# Altium footprint library 13-Pcblib_MCU.PcbLib: 48 footprints (part 1 of 3)
Each footprint in its own frame and in the unit in brackets; x right, y up, seen from the top. Pads: shape width x height; smd on the part's side, far side on the other; paste and mask are expansions set on the pad; w line width, h text height; cw(c..) or ccw(c..) is an arc to the next point about the centre after c.
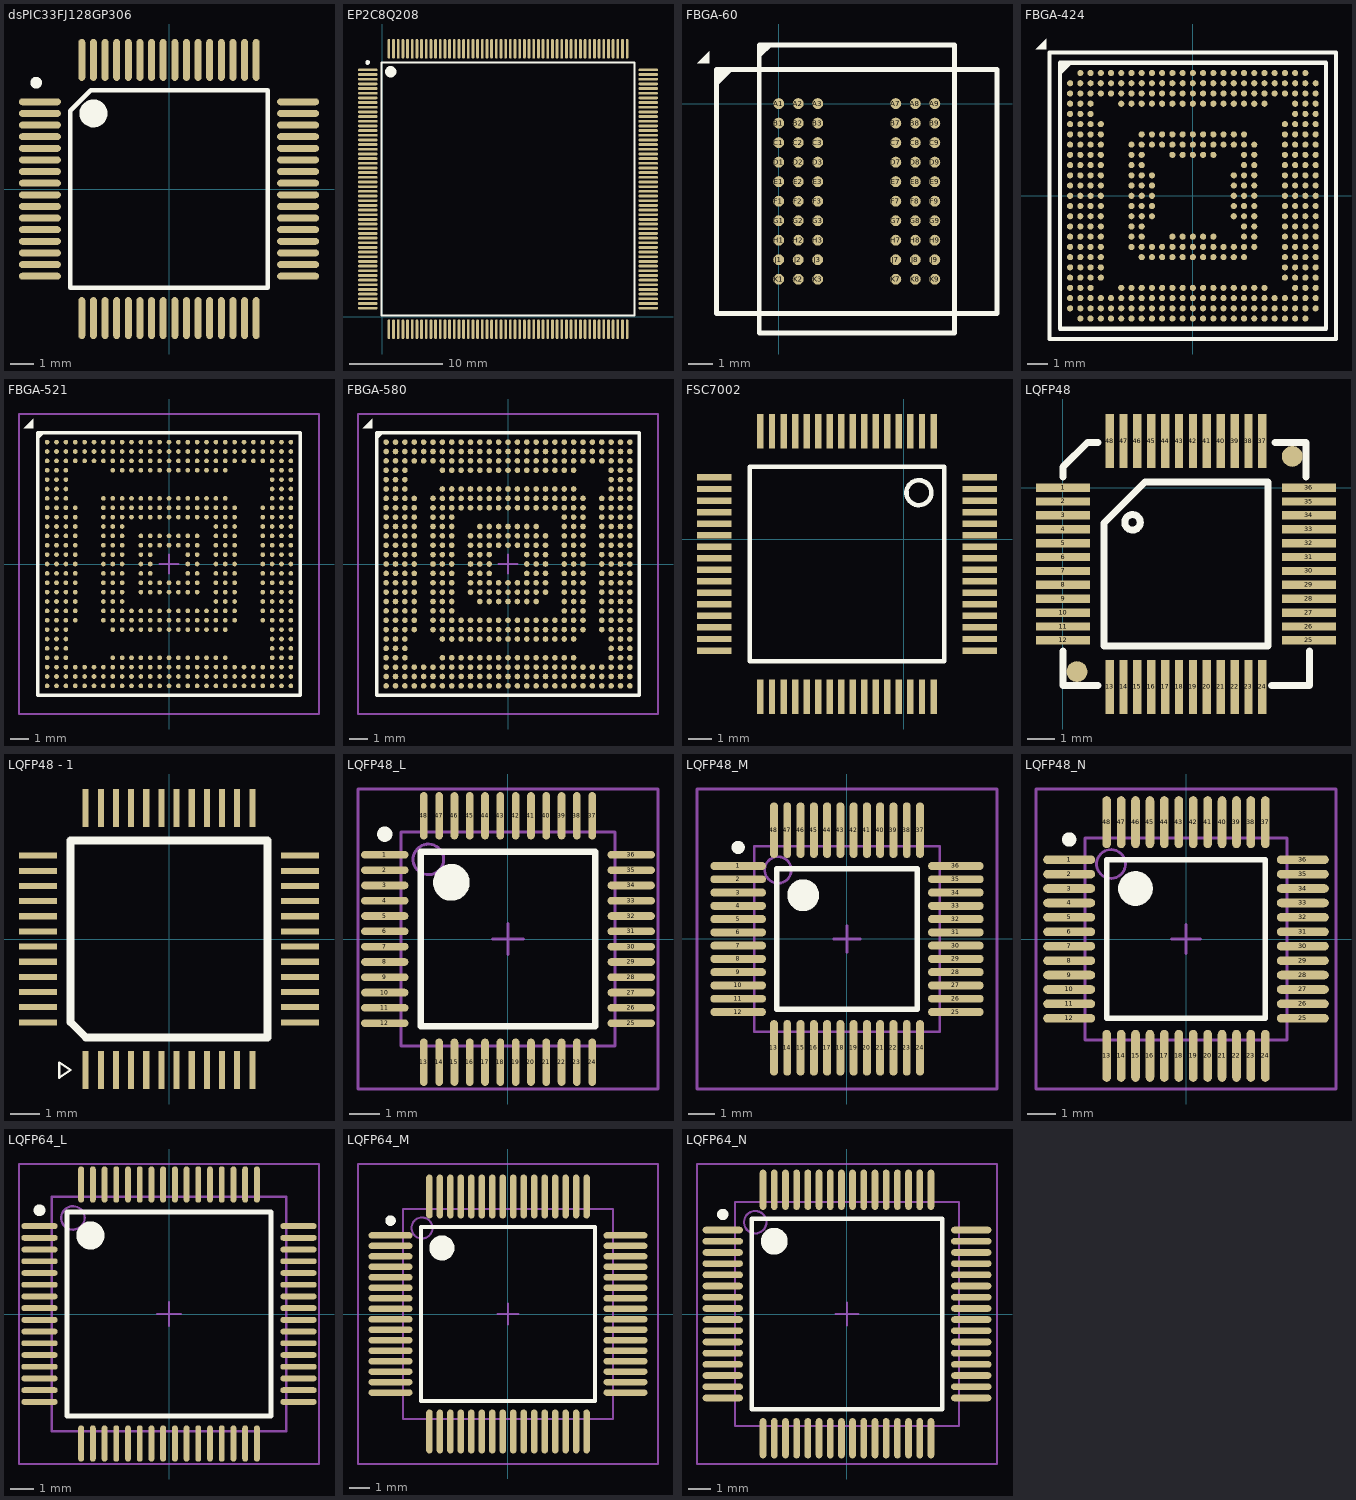
[diagram p0: the footprints below, top view; thin cyan lines are the x and y axes]

## AM335X033_W [mm]
3D body: height 3.3, standoff -6.36, extent -36.168,-23.089 33.832,22.911

## dsPIC33FJ128GP306 [mm]
height 0.9
pads (64):
  oval 1.8x0.3 smd: 1(-5.55,3.75) 2(-5.55,3.25) 3(-5.55,2.75) 4(-5.55,2.25) 5(-5.55,1.75) 6(-5.55,1.25) 7(-5.55,0.75) 8(-5.55,0.25) 9(-5.55,-0.25) 10(-5.55,-0.75) 11(-5.55,-1.25) 12(-5.55,-1.75) 13(-5.55,-2.25) 14(-5.55,-2.75) 15(-5.55,-3.25) 16(-5.55,-3.75) 33(5.55,-3.75) 34(5.55,-3.25) 35(5.55,-2.75) 36(5.55,-2.25) 37(5.55,-1.75) 38(5.55,-1.25) 39(5.55,-0.75) 40(5.55,-0.25) 41(5.55,0.25) 42(5.55,0.75) 43(5.55,1.25) 44(5.55,1.75) 45(5.55,2.25) 46(5.55,2.75) 47(5.55,3.25) 48(5.55,3.75)
  oval 0.3x1.8 smd: 17(-3.75,-5.55) 18(-3.25,-5.55) 19(-2.75,-5.55) 20(-2.25,-5.55) 21(-1.75,-5.55) 22(-1.25,-5.55) 23(-0.75,-5.55) 24(-0.25,-5.55) 25(0.25,-5.55) 26(0.75,-5.55) 27(1.25,-5.55) 28(1.75,-5.55) 29(2.25,-5.55) 30(2.75,-5.55) 31(3.25,-5.55) 32(3.75,-5.55) 49(3.75,5.55) 50(3.25,5.55) 51(2.75,5.55) 52(2.25,5.55) 53(1.75,5.55) 54(1.25,5.55) 55(0.75,5.55) 56(0.25,5.55) 57(-0.25,5.55) 58(-0.75,5.55) 59(-1.25,5.55) 60(-1.75,5.55) 61(-2.25,5.55) 62(-2.75,5.55) 63(-3.25,5.55) 64(-3.75,5.55)
Top Overlay:
  circle w0.25: c-5.713,4.572 r0.125
  circle w0.6: c-3.25,3.25 r0.3
  lines w0.2: -4.25,-4.25 -4.25,3.37 -3.37,4.25 4.25,4.25 4.25,-4.25 -4.25,-4.25
3D body: height 1.63, standoff 0, extent -6.072,-6.096 6.072,6.048

## EP2C8Q208 [mm]
pads (208):
  oval 2.1x0.3 smd: 1(-1.524,26.416) 2(-1.524,25.916) 3(-1.524,25.416) 4(-1.524,24.916) 5(-1.524,24.416) 6(-1.524,23.916) 7(-1.524,23.416) 8(-1.524,22.916) 9(-1.524,22.416) 10(-1.524,21.916) 11(-1.524,21.416) 12(-1.524,20.916) 13(-1.524,20.416) 14(-1.524,19.916) 15(-1.524,19.416) 16(-1.524,18.916) 17(-1.524,18.416) 18(-1.524,17.916) 19(-1.524,17.416) 20(-1.524,16.916) 21(-1.524,16.416) 22(-1.524,15.916) 23(-1.524,15.416) 24(-1.524,14.916) 25(-1.524,14.416) 26(-1.524,13.916) 27(-1.524,13.416) 28(-1.524,12.916) 29(-1.524,12.416) 30(-1.524,11.916) 31(-1.524,11.416) 32(-1.524,10.916) 33(-1.524,10.416) 34(-1.524,9.916) 35(-1.524,9.416) 36(-1.524,8.916) 37(-1.524,8.416) 38(-1.524,7.916) 39(-1.524,7.416) 40(-1.524,6.916) 41(-1.524,6.416) 42(-1.524,5.916) 43(-1.524,5.416) 44(-1.524,4.916) 45(-1.524,4.416) 46(-1.524,3.916) 47(-1.524,3.416) 48(-1.524,2.916) 49(-1.524,2.416) 50(-1.524,1.916) 51(-1.524,1.416) 52(-1.524,0.916) 105(28.476,0.916) 106(28.476,1.416) 107(28.476,1.916) 108(28.476,2.416) 109(28.476,2.916) 110(28.476,3.416) 111(28.476,3.916) 112(28.476,4.416) 113(28.476,4.916) 114(28.476,5.416) 115(28.476,5.916) 116(28.476,6.416) 117(28.476,6.916) 118(28.476,7.416) 119(28.476,7.916) 120(28.476,8.416) 121(28.476,8.916) 122(28.476,9.416) 123(28.476,9.916) 124(28.476,10.416) 125(28.476,10.916) 126(28.476,11.416) 127(28.476,11.916) 128(28.476,12.416) 129(28.476,12.916) 130(28.476,13.416) 131(28.476,13.916) 132(28.476,14.416) 133(28.476,14.916) 134(28.476,15.416) 135(28.476,15.916) 136(28.476,16.416) 137(28.476,16.916) 138(28.476,17.416) 139(28.476,17.916) 140(28.476,18.416) 141(28.476,18.916) 142(28.476,19.416) 143(28.476,19.916) 144(28.476,20.416) 145(28.476,20.916) 146(28.476,21.416) 147(28.476,21.916) 148(28.476,22.416) 149(28.476,22.916) 150(28.476,23.416) 151(28.476,23.916) 152(28.476,24.416) 153(28.476,24.916) 154(28.476,25.416) 155(28.476,25.916) 156(28.476,26.416)
  oval 0.3x2.1 smd: 53(0.726,-1.334) 54(1.226,-1.334) 55(1.726,-1.334) 56(2.226,-1.334) 57(2.726,-1.334) 58(3.226,-1.334) 59(3.726,-1.334) 60(4.226,-1.334) 61(4.726,-1.334) 62(5.226,-1.334) 63(5.726,-1.334) 64(6.226,-1.334) 65(6.726,-1.334) 66(7.226,-1.334) 67(7.726,-1.334) 68(8.226,-1.334) 69(8.726,-1.334) 70(9.226,-1.334) 71(9.726,-1.334) 72(10.226,-1.334) 73(10.726,-1.334) 74(11.226,-1.334) 75(11.726,-1.334) 76(12.226,-1.334) 77(12.726,-1.334) 78(13.226,-1.334) 79(13.726,-1.334) 80(14.226,-1.334) 81(14.726,-1.334) 82(15.226,-1.334) 83(15.726,-1.334) 84(16.226,-1.334) 85(16.726,-1.334) 86(17.226,-1.334) 87(17.726,-1.334) 88(18.226,-1.334) 89(18.726,-1.334) 90(19.226,-1.334) 91(19.726,-1.334) 92(20.226,-1.334) 93(20.726,-1.334) 94(21.226,-1.334) 95(21.726,-1.334) 96(22.226,-1.334) 97(22.726,-1.334) 98(23.226,-1.334) 99(23.726,-1.334) 100(24.226,-1.334) 101(24.726,-1.334) 102(25.226,-1.334) 103(25.726,-1.334) 104(26.226,-1.334) 157(26.226,28.666) 158(25.726,28.666) 159(25.226,28.666) 160(24.726,28.666) 161(24.226,28.666) 162(23.726,28.666) 163(23.226,28.666) 164(22.726,28.666) 165(22.226,28.666) 166(21.726,28.666) 167(21.226,28.666) 168(20.726,28.666) 169(20.226,28.666) 170(19.726,28.666) 171(19.226,28.666) 172(18.726,28.666) 173(18.226,28.666) 174(17.726,28.666) 175(17.226,28.666) 176(16.726,28.666) 177(16.226,28.666) 178(15.726,28.666) 179(15.226,28.666) 180(14.726,28.666) 181(14.226,28.666) 182(13.726,28.666) 183(13.226,28.666) 184(12.726,28.666) 185(12.226,28.666) 186(11.726,28.666) 187(11.226,28.666) 188(10.726,28.666) 189(10.226,28.666) 190(9.726,28.666) 191(9.226,28.666) 192(8.726,28.666) 193(8.226,28.666) 194(7.726,28.666) 195(7.226,28.666) 196(6.726,28.666) 197(6.226,28.666) 198(5.726,28.666) 199(5.226,28.666) 200(4.726,28.666) 201(4.226,28.666) 202(3.726,28.666) 203(3.226,28.666) 204(2.726,28.666) 205(2.226,28.666) 206(1.726,28.666) 207(1.226,28.666) 208(0.726,28.666)
Top Overlay:
  circle w0.6: c0.926,26.216 r0.3
  circle w0.25: c-1.547,27.203 r0.125
  lines w0.2: -0.074,0.116 27.026,0.116 27.026,27.216 -0.074,27.216 -0.074,0.116
3D body: height 3.5, standoff 0, extent -1.831,-1.579 28.755,29.007

## FBGA-60 [mm]
pads (60):
  round 0.45 smd: A1(0,0) A2(0.8,0) A3(1.6,0) A7(4.8,0) A8(5.6,0) A9(6.4,0) B1(0,-0.8) B2(0.8,-0.8) B3(1.6,-0.8) B7(4.8,-0.8) B8(5.6,-0.8) B9(6.4,-0.8) C1(0,-1.6) C2(0.8,-1.6) C3(1.6,-1.6) C7(4.8,-1.6) C8(5.6,-1.6) C9(6.4,-1.6) D1(0,-2.4) D2(0.8,-2.4) D3(1.6,-2.4) D7(4.8,-2.4) D8(5.6,-2.4) D9(6.4,-2.4) E1(0,-3.2) E2(0.8,-3.2) E3(1.6,-3.2) E7(4.8,-3.2) E8(5.6,-3.2) E9(6.4,-3.2) F1(0,-4) F2(0.8,-4) F3(1.6,-4) F7(4.8,-4) F8(5.6,-4) F9(6.4,-4) G1(0,-4.8) G2(0.8,-4.8) G3(1.6,-4.8) G7(4.8,-4.8) G8(5.6,-4.8) G9(6.4,-4.8) H1(0,-5.6) H2(0.8,-5.6) H3(1.6,-5.6) H7(4.8,-5.6) H8(5.6,-5.6) H9(6.4,-5.6) J1(0,-6.4) J2(0.8,-6.4) J3(1.6,-6.4) J7(4.8,-6.4) J8(5.6,-6.4) J9(6.4,-6.4) K1(0,-7.2) K2(0.8,-7.2) K3(1.6,-7.2) K7(4.8,-7.2) K8(5.6,-7.2) K9(6.4,-7.2)
Top Overlay:
  region: -2.85,1.65 -2.85,2.15 -3.35,1.65
  region: -2.45,1.3 -1.95,1.3 -2.45,0.8
  region: -0.75,2.4 -0.25,2.4 -0.75,1.9
  lines w0.2: -2.55,-8.6 8.95,-8.6 8.95,1.4 -2.55,1.4 -2.55,-8.6 ; -0.8,-9.4 -0.8,2.4 7.2,2.4 7.2,-9.4 -0.8,-9.4

## FBGA-424 [mm]
pads (426):
  round 0.3 smd: A2(-5.496,6) A3(-4.996,6) A4(-4.496,6) A5(-3.996,6) A6(-3.496,6) A7(-2.996,6) A8(-2.496,6) A9(-1.996,6) A10(-1.496,6) A11(-0.996,6) A12(-0.496,6) A13(0.004,6) A14(0.504,6) A15(1.004,6) A16(1.504,6) A17(2.004,6) A18(2.504,6) A19(3.004,6) A20(3.504,6) A21(4.004,6) A22(4.504,6) A23(5.004,6) A24(5.504,6) AA1(-5.996,-4) AA2(-5.496,-4) AA3(-4.996,-4) AA4(-4.496,-4) AA22(4.504,-4) AA23(5.004,-4) AA24(5.504,-4) AA25(6.004,-4) AB1(-5.996,-4.5) AB2(-5.496,-4.5) AB3(-4.996,-4.5) AB6(-3.496,-4.5) AB7(-2.996,-4.5) AB8(-2.496,-4.5) AB9(-1.996,-4.5) AB10(-1.496,-4.5) AB11(-0.996,-4.5) AB12(-0.496,-4.5) AB13(0.004,-4.5) AB14(0.504,-4.5) AB15(1.004,-4.5) AB16(1.504,-4.5) AB17(2.004,-4.5) AB18(2.504,-4.5) AB19(3.004,-4.5) AB20(3.504,-4.5) AB23(5.004,-4.5) AB24(5.504,-4.5) AB25(6.004,-4.5) AC1(-5.996,-5) AC2(-5.496,-5) AC3(-4.996,-5) AC4(-4.496,-5) AC5(-3.996,-5) AC6(-3.496,-5) AC7(-2.996,-5) AC8(-2.496,-5) AC9(-1.996,-5) AC10(-1.496,-5) AC11(-0.996,-5) AC12(-0.496,-5) AC13(0.004,-5) AC14(0.504,-5) AC15(1.004,-5) AC16(1.504,-5) AC17(2.004,-5) AC18(2.504,-5) AC19(3.004,-5) AC20(3.504,-5) AC21(4.004,-5) AC22(4.504,-5) AC23(5.004,-5) AC24(5.504,-5) AC25(6.004,-5) AD1(-5.996,-5.5) AD2(-5.496,-5.5) AD3(-4.996,-5.5) AD4(-4.496,-5.5) AD5(-3.996,-5.5) AD6(-3.496,-5.5) AD7(-2.996,-5.5) AD8(-2.496,-5.5) AD9(-1.996,-5.5) AD10(-1.496,-5.5) AD11(-0.996,-5.5) AD12(-0.496,-5.5) AD13(0.004,-5.5) AD14(0.504,-5.5) AD15(1.004,-5.5) AD16(1.504,-5.5) AD17(2.004,-5.5) AD18(2.504,-5.5) AD19(3.004,-5.5) AD20(3.504,-5.5) AD21(4.004,-5.5) AD22(4.504,-5.5) AD23(5.004,-5.5) AD24(5.504,-5.5) AD25(6.004,-5.5) AE2(-5.496,-6) AE3(-4.996,-6) AE4(-4.496,-6) AE5(-3.996,-6) AE6(-3.496,-6) AE7(-2.996,-6) AE8(-2.496,-6) AE9(-1.996,-6) AE10(-1.496,-6) AE11(-0.996,-6) AE12(-0.496,-6) AE13(0.004,-6) AE14(0.504,-6) AE15(1.004,-6) AE16(1.504,-6) AE17(2.004,-6) AE18(2.504,-6) AE19(3.004,-6) AE20(3.504,-6) AE21(4.004,-6) AE22(4.504,-6) AE23(5.004,-6) AE24(5.504,-6) B1(-5.996,5.5) B2(-5.496,5.5) B3(-4.996,5.5) B4(-4.496,5.5) B5(-3.996,5.5) B6(-3.496,5.5) B7(-2.996,5.5) B8(-2.496,5.5) B9(-1.996,5.5) B10(-1.496,5.5) B11(-0.996,5.5) B12(-0.496,5.5) B13(0.004,5.5) B14(0.504,5.5) B15(1.004,5.5) B16(1.504,5.5) B17(2.004,5.5) B18(2.504,5.5) B19(3.004,5.5) B20(3.504,5.5) B21(4.004,5.5) B22(4.504,5.5) B23(5.004,5.5) B24(5.504,5.5) B25(6.004,5.5) C1(-5.996,5) C2(-5.496,5) C3(-4.996,5) C4(-4.496,5) C5(-3.996,5) C6(-3.496,5) C7(-2.996,5) C8(-2.496,5) C9(-1.996,5) C10(-1.496,5) C11(-0.996,5) C12(-0.496,5) C13(0.004,5) C14(0.504,5) C15(1.004,5) C16(1.504,5) C17(2.004,5) C18(2.504,5) C19(3.004,5) C20(3.504,5) C21(4.004,5) C22(4.504,5) C23(5.004,5) C24(5.504,5) C25(6.004,5) D1(-5.996,4.5) D2(-5.496,4.5) D3(-4.996,4.5) D6(-3.496,4.5) D7(-2.996,4.5) D8(-2.496,4.5) D9(-1.996,4.5) D10(-1.496,4.5) D11(-0.996,4.5) D12(-0.496,4.5) D13(0.004,4.5) D14(0.504,4.5) D15(1.004,4.5) D16(1.504,4.5) D17(2.004,4.5) D18(2.504,4.5) D19(3.004,4.5) D20(3.504,4.5) D23(5.004,4.5) D24(5.504,4.5) D25(6.004,4.5) E1(-5.996,4) E2(-5.496,4) E3(-4.996,4) E23(5.004,4) E24(5.504,4) E25(6.004,4) F1(-5.996,3.5) F2(-5.496,3.5) F3(-4.996,3.5) F4(-4.496,3.5) F22(4.504,3.5) F23(5.004,3.5) F24(5.504,3.5) F25(6.004,3.5) G1(-5.996,3) G2(-5.496,3) G3(-4.996,3) G4(-4.496,3) G8(-2.496,3) G9(-1.996,3) G10(-1.496,3) G11(-0.996,3) G12(-0.496,3) G13(0.004,3) G14(0.504,3) G15(1.004,3) G16(1.504,3) G17(2.004,3) G18(2.504,3) G22(4.504,3) G23(5.004,3) G24(5.504,3) G25(6.004,3) H1(-5.996,2.5) H2(-5.496,2.5) H3(-4.996,2.5) H4(-4.496,2.5) H7(-2.996,2.5) H8(-2.496,2.5) H9(-1.996,2.5) H10(-1.496,2.5) H11(-0.996,2.5) H12(-0.496,2.5) H13(0.004,2.5) H14(0.504,2.5) H15(1.004,2.5) H16(1.504,2.5) H17(2.004,2.5) H18(2.504,2.5) H19(3.004,2.5) H22(4.504,2.5) H23(5.004,2.5) H24(5.504,2.5) H25(6.004,2.5) J1(-5.996,2) J2(-5.496,2) J3(-4.996,2) J4(-4.496,2) J7(-2.996,2) J8(-2.496,2) J11(-0.996,2) J12(-0.496,2) J13(0.004,2) J14(0.504,2) J15(1.004,2) J18(2.504,2) J19(3.004,2) J22(4.504,2) J23(5.004,2) J24(5.504,2) J25(6.004,2) K1(-5.996,1.5) K2(-5.496,1.5) K3(-4.996,1.5) K4(-4.496,1.5) K7(-2.996,1.5) K8(-2.496,1.5) K18(2.504,1.5) K19(3.004,1.5) K22(4.504,1.5) K23(5.004,1.5) K24(5.504,1.5) K25(6.004,1.5) L1(-5.996,1) L2(-5.496,1) L3(-4.996,1) L4(-4.496,1) L7(-2.996,1) L8(-2.496,1) L9(-1.996,1) L17(2.004,1) L18(2.504,1) L19(3.004,1) L22(4.504,1) L23(5.004,1) L24(5.504,1) L25(6.004,1) M1(-5.996,0.5) M2(-5.496,0.5) M3(-4.996,0.5) M4(-4.496,0.5) M7(-2.996,0.5) M8(-2.496,0.5) M9(-1.996,0.5) M17(2.004,0.5) M18(2.504,0.5) M19(3.004,0.5) M22(4.504,0.5) M23(5.004,0.5) M24(5.504,0.5) M25(6.004,0.5) N1(-5.996,0) N2(-5.496,0) N3(-4.996,0) N4(-4.496,0) N7(-2.996,0) N8(-2.496,0) N9(-1.996,0) N17(2.004,0) N18(2.504,0) N19(3.004,0) N22(4.504,0) N23(5.004,0) N24(5.504,0) N25(6.004,0) P1(-5.996,-0.5) P2(-5.496,-0.5) P3(-4.996,-0.5) P4(-4.496,-0.5) P7(-2.996,-0.5) P8(-2.496,-0.5) P9(-1.996,-0.5) P17(2.004,-0.5) P18(2.504,-0.5) P19(3.004,-0.5) P22(4.504,-0.5) P23(5.004,-0.5) P24(5.504,-0.5) P25(6.004,-0.5) R1(-5.996,-1) R2(-5.496,-1) R3(-4.996,-1) R4(-4.496,-1) R7(-2.996,-1) R8(-2.496,-1) R9(-1.996,-1) R17(2.004,-1) R18(2.504,-1) R19(3.004,-1) R22(4.504,-1) R23(5.004,-1) R24(5.504,-1) R25(6.004,-1) T1(-5.996,-1.5) T2(-5.496,-1.5) T3(-4.996,-1.5) T4(-4.496,-1.5) T7(-2.996,-1.5) T8(-2.496,-1.5) T18(2.504,-1.5) T19(3.004,-1.5) T22(4.504,-1.5) T23(5.004,-1.5) T24(5.504,-1.5) T25(6.004,-1.5) U1(-5.996,-2) U2(-5.496,-2) U3(-4.996,-2) U4(-4.496,-2) U7(-2.996,-2) U8(-2.496,-2) U11(-0.996,-2) U12(-0.496,-2) U13(0.004,-2) U14(0.504,-2) U15(1.004,-2) U18(2.504,-2) U19(3.004,-2) U22(4.504,-2) U23(5.004,-2) U24(5.504,-2) U25(6.004,-2) V1(-5.996,-2.5) V2(-5.496,-2.5) V3(-4.996,-2.5) V4(-4.496,-2.5) V7(-2.996,-2.5) V8(-2.496,-2.5) V9(-1.996,-2.5) V10(-1.496,-2.5) V11(-0.996,-2.5) V12(-0.496,-2.5) V13(0.004,-2.5) V14(0.504,-2.5) V15(1.004,-2.5) V16(1.504,-2.5) V17(2.004,-2.5) V18(2.504,-2.5) V19(3.004,-2.5) V22(4.504,-2.5) V23(5.004,-2.5) V24(5.504,-2.5) V25(6.004,-2.5) W1(-5.996,-3) W2(-5.496,-3) W3(-4.996,-3) W4(-4.496,-3) W8(-2.496,-3) W9(-1.996,-3) W10(-1.496,-3) W11(-0.996,-3) W12(-0.496,-3) W13(0.004,-3) W14(0.504,-3) W15(1.004,-3) W16(1.504,-3) W17(2.004,-3) W18(2.504,-3) W22(4.504,-3) W23(5.004,-3) W24(5.504,-3) W25(6.004,-3) Y1(-5.996,-3.5) Y2(-5.496,-3.5) Y3(-4.996,-3.5) Y4(-4.496,-3.5) Y22(4.504,-3.5) Y23(5.004,-3.5) Y24(5.504,-3.5) Y25(6.004,-3.5)
Top Overlay:
  region: -7.163,7.163 -7.163,7.663 -7.663,7.163
  lines w0.2: -6.496,6 -5.996,6.5 ; -6.496,6.254 -6.25,6.5 ; -7,-7 -7,7 7,7 7,-7 -7,-7 ; -6.496,-6.5 -6.496,6.5 6.504,6.5 6.504,-6.5 -6.496,-6.5

## FBGA-521 [mm] "BGA, 521-Leads, Body 14.0x14.0mm,  Pitch 0.50mm"
height 1.5
pads (521):
  round 0.25 smd: A1(-6.5,6.5) A2(-6,6.5) A3(-5.5,6.5) A4(-5,6.5) A5(-4.5,6.5) A6(-4,6.5) A7(-3.5,6.5) A8(-3,6.5) A9(-2.5,6.5) A10(-2,6.5) A11(-1.5,6.5) A12(-1,6.5) A13(-0.5,6.5) A14(0,6.5) A15(0.5,6.5) A16(1,6.5) A17(1.5,6.5) A18(2,6.5) A19(2.5,6.5) A20(3,6.5) A21(3.5,6.5) A22(4,6.5) A23(4.5,6.5) A24(5,6.5) A25(5.5,6.5) A26(6,6.5) A27(6.5,6.5) AA1(-6.5,-3.5) AA2(-6,-3.5) AA3(-5.5,-3.5) AA8(-3,-3.5) AA9(-2.5,-3.5) AA10(-2,-3.5) AA11(-1.5,-3.5) AA12(-1,-3.5) AA13(-0.5,-3.5) AA14(0,-3.5) AA15(0.5,-3.5) AA16(1,-3.5) AA17(1.5,-3.5) AA18(2,-3.5) AA19(2.5,-3.5) AA20(3,-3.5) AA25(5.5,-3.5) AA26(6,-3.5) AA27(6.5,-3.5) AB1(-6.5,-4) AB2(-6,-4) AB3(-5.5,-4) AB25(5.5,-4) AB26(6,-4) AB27(6.5,-4) AC1(-6.5,-4.5) AC2(-6,-4.5) AC3(-5.5,-4.5) AC25(5.5,-4.5) AC26(6,-4.5) AC27(6.5,-4.5) AD1(-6.5,-5) AD2(-6,-5) AD3(-5.5,-5) AD8(-3,-5) AD9(-2.5,-5) AD10(-2,-5) AD11(-1.5,-5) AD12(-1,-5) AD13(-0.5,-5) AD14(0,-5) AD15(0.5,-5) AD16(1,-5) AD17(1.5,-5) AD18(2,-5) AD19(2.5,-5) AD20(3,-5) AD25(5.5,-5) AD26(6,-5) AD27(6.5,-5) AE1(-6.5,-5.5) AE2(-6,-5.5) AE3(-5.5,-5.5) AE4(-5,-5.5) AE5(-4.5,-5.5) AE6(-4,-5.5) AE7(-3.5,-5.5) AE8(-3,-5.5) AE9(-2.5,-5.5) AE10(-2,-5.5) AE11(-1.5,-5.5) AE12(-1,-5.5) AE13(-0.5,-5.5) AE14(0,-5.5) AE15(0.5,-5.5) AE16(1,-5.5) AE17(1.5,-5.5) AE18(2,-5.5) AE19(2.5,-5.5) AE20(3,-5.5) AE21(3.5,-5.5) AE22(4,-5.5) AE23(4.5,-5.5) AE24(5,-5.5) AE25(5.5,-5.5) AE26(6,-5.5) AE27(6.5,-5.5) AF1(-6.5,-6) AF2(-6,-6) AF3(-5.5,-6) AF4(-5,-6) AF5(-4.5,-6) AF6(-4,-6) AF7(-3.5,-6) AF8(-3,-6) AF9(-2.5,-6) AF10(-2,-6) AF11(-1.5,-6) AF12(-1,-6) AF13(-0.5,-6) AF14(0,-6) AF15(0.5,-6) AF16(1,-6) AF17(1.5,-6) AF18(2,-6) AF19(2.5,-6) AF20(3,-6) AF21(3.5,-6) AF22(4,-6) AF23(4.5,-6) AF24(5,-6) AF25(5.5,-6) AF26(6,-6) AF27(6.5,-6) AG1(-6.5,-6.5) AG2(-6,-6.5) AG3(-5.5,-6.5) AG4(-5,-6.5) AG5(-4.5,-6.5) AG6(-4,-6.5) AG7(-3.5,-6.5) AG8(-3,-6.5) AG9(-2.5,-6.5) AG10(-2,-6.5) AG11(-1.5,-6.5) AG12(-1,-6.5) AG13(-0.5,-6.5) AG14(0,-6.5) AG15(0.5,-6.5) AG16(1,-6.5) AG17(1.5,-6.5) AG18(2,-6.5) AG19(2.5,-6.5) AG20(3,-6.5) AG21(3.5,-6.5) AG22(4,-6.5) AG23(4.5,-6.5) AG24(5,-6.5) AG25(5.5,-6.5) AG26(6,-6.5) AG27(6.5,-6.5) B1(-6.5,6) B2(-6,6) B3(-5.5,6) B4(-5,6) B5(-4.5,6) B6(-4,6) B7(-3.5,6) B8(-3,6) B9(-2.5,6) B10(-2,6) B11(-1.5,6) B12(-1,6) B13(-0.5,6) B14(0,6) B15(0.5,6) B16(1,6) B17(1.5,6) B18(2,6) B19(2.5,6) B20(3,6) B21(3.5,6) B22(4,6) B23(4.5,6) B24(5,6) B25(5.5,6) B26(6,6) B27(6.5,6) C1(-6.5,5.5) C2(-6,5.5) C3(-5.5,5.5) C4(-5,5.5) C5(-4.5,5.5) C6(-4,5.5) C7(-3.5,5.5) C8(-3,5.5) C9(-2.5,5.5) C10(-2,5.5) C11(-1.5,5.5) C12(-1,5.5) C13(-0.5,5.5) C14(0,5.5) C15(0.5,5.5) C16(1,5.5) C17(1.5,5.5) C18(2,5.5) C19(2.5,5.5) C20(3,5.5) C21(3.5,5.5) C22(4,5.5) C23(4.5,5.5) C24(5,5.5) C25(5.5,5.5) C26(6,5.5) C27(6.5,5.5) D1(-6.5,5) D2(-6,5) D3(-5.5,5) D8(-3,5) D9(-2.5,5) D10(-2,5) D11(-1.5,5) D12(-1,5) D13(-0.5,5) D14(0,5) D15(0.5,5) D16(1,5) D17(1.5,5) D18(2,5) D19(2.5,5) D20(3,5) D25(5.5,5) D26(6,5) D27(6.5,5) E1(-6.5,4.5) E2(-6,4.5) E3(-5.5,4.5) E25(5.5,4.5) E26(6,4.5) E27(6.5,4.5) F1(-6.5,4) F2(-6,4) F3(-5.5,4) F25(5.5,4) F26(6,4) F27(6.5,4) G1(-6.5,3.5) G2(-6,3.5) G3(-5.5,3.5) G7(-3.5,3.5) G8(-3,3.5) G9(-2.5,3.5) G10(-2,3.5) G11(-1.5,3.5) G12(-1,3.5) G13(-0.5,3.5) G14(0,3.5) G15(0.5,3.5) G16(1,3.5) G17(1.5,3.5) G18(2,3.5) G19(2.5,3.5) G20(3,3.5) G25(5.5,3.5) G26(6,3.5) G27(6.5,3.5) H1(-6.5,3) H2(-6,3) H3(-5.5,3) H4(-5,3) H7(-3.5,3) H8(-3,3) H9(-2.5,3) H10(-2,3) H11(-1.5,3) H12(-1,3) H13(-0.5,3) H14(0,3) H15(0.5,3) H16(1,3) H17(1.5,3) H18(2,3) H19(2.5,3) H20(3,3) H21(3.5,3) H24(5,3) H25(5.5,3) H26(6,3) H27(6.5,3) J1(-6.5,2.5) J2(-6,2.5) J3(-5.5,2.5) J4(-5,2.5) J7(-3.5,2.5) J8(-3,2.5) J9(-2.5,2.5) J10(-2,2.5) J11(-1.5,2.5) J12(-1,2.5) J13(-0.5,2.5) J14(0,2.5) J15(0.5,2.5) J16(1,2.5) J17(1.5,2.5) J18(2,2.5) J19(2.5,2.5) J20(3,2.5) J21(3.5,2.5) J24(5,2.5) J25(5.5,2.5) J26(6,2.5) J27(6.5,2.5) K1(-6.5,2) K2(-6,2) K3(-5.5,2) K4(-5,2) K7(-3.5,2) K8(-3,2) K9(-2.5,2) K19(2.5,2) K20(3,2) K21(3.5,2) K24(5,2) K25(5.5,2) K26(6,2) K27(6.5,2) L1(-6.5,1.5) L2(-6,1.5) L3(-5.5,1.5) L4(-5,1.5) L7(-3.5,1.5) L8(-3,1.5) L9(-2.5,1.5) L11(-1.5,1.5) L12(-1,1.5) L13(-0.5,1.5) L14(0,1.5) L15(0.5,1.5) L16(1,1.5) L17(1.5,1.5) L19(2.5,1.5) L20(3,1.5) L21(3.5,1.5) L24(5,1.5) L25(5.5,1.5) L26(6,1.5) L27(6.5,1.5) M1(-6.5,1) M2(-6,1) M3(-5.5,1) M4(-5,1) M7(-3.5,1) M8(-3,1) M9(-2.5,1) M11(-1.5,1) M12(-1,1) M13(-0.5,1) M14(0,1) M15(0.5,1) M16(1,1) M17(1.5,1) M19(2.5,1) M20(3,1) M21(3.5,1) M24(5,1) M25(5.5,1) M26(6,1) M27(6.5,1) N1(-6.5,0.5) N2(-6,0.5) N3(-5.5,0.5) N4(-5,0.5) N7(-3.5,0.5) N8(-3,0.5) N9(-2.5,0.5) N11(-1.5,0.5) N12(-1,0.5) N16(1,0.5) N17(1.5,0.5) N19(2.5,0.5) N20(3,0.5) N21(3.5,0.5) N24(5,0.5) N25(5.5,0.5) N26(6,0.5) N27(6.5,0.5) P1(-6.5,0) P2(-6,0) P3(-5.5,0) P4(-5,0) P7(-3.5,0) P8(-3,0) P9(-2.5,0) P11(-1.5,0) P12(-1,0) P16(1,0) P17(1.5,0) P19(2.5,0) P20(3,0) P21(3.5,0) P24(5,0) P25(5.5,0) P26(6,0) P27(6.5,0) R1(-6.5,-0.5) R2(-6,-0.5) R3(-5.5,-0.5) R4(-5,-0.5) R7(-3.5,-0.5) R8(-3,-0.5) R9(-2.5,-0.5) R11(-1.5,-0.5) R12(-1,-0.5) R16(1,-0.5) R17(1.5,-0.5) R19(2.5,-0.5) R20(3,-0.5) R21(3.5,-0.5) R24(5,-0.5) R25(5.5,-0.5) R26(6,-0.5) R27(6.5,-0.5) T1(-6.5,-1) T2(-6,-1) T3(-5.5,-1) T4(-5,-1) T7(-3.5,-1) T8(-3,-1) T9(-2.5,-1) T11(-1.5,-1) T12(-1,-1) T13(-0.5,-1) T14(0,-1) T15(0.5,-1) T16(1,-1) T17(1.5,-1) T19(2.5,-1) T20(3,-1) T21(3.5,-1) T24(5,-1) T25(5.5,-1) T26(6,-1) T27(6.5,-1) U1(-6.5,-1.5) U2(-6,-1.5) U3(-5.5,-1.5) U4(-5,-1.5) U7(-3.5,-1.5) U8(-3,-1.5) U9(-2.5,-1.5) U11(-1.5,-1.5) U12(-1,-1.5) U13(-0.5,-1.5) U14(0,-1.5) U15(0.5,-1.5) U16(1,-1.5) U17(1.5,-1.5) U19(2.5,-1.5) U20(3,-1.5) U21(3.5,-1.5) U24(5,-1.5) U25(5.5,-1.5) U26(6,-1.5) U27(6.5,-1.5) V1(-6.5,-2) V2(-6,-2) V3(-5.5,-2) V4(-5,-2) V7(-3.5,-2) V8(-3,-2) V9(-2.5,-2) V19(2.5,-2) V20(3,-2) V21(3.5,-2) V24(5,-2) V25(5.5,-2) V26(6,-2) V27(6.5,-2) W1(-6.5,-2.5) W2(-6,-2.5) W3(-5.5,-2.5) W4(-5,-2.5) W7(-3.5,-2.5) W8(-3,-2.5) W9(-2.5,-2.5) W10(-2,-2.5) W11(-1.5,-2.5) W12(-1,-2.5) W13(-0.5,-2.5) W14(0,-2.5) W15(0.5,-2.5) W16(1,-2.5) W17(1.5,-2.5) W18(2,-2.5) W19(2.5,-2.5) W20(3,-2.5) W21(3.5,-2.5) W24(5,-2.5) W25(5.5,-2.5) W26(6,-2.5) W27(6.5,-2.5) Y1(-6.5,-3) Y2(-6,-3) Y3(-5.5,-3) Y4(-5,-3) Y7(-3.5,-3) Y8(-3,-3) Y9(-2.5,-3) Y10(-2,-3) Y11(-1.5,-3) Y12(-1,-3) Y13(-0.5,-3) Y14(0,-3) Y15(0.5,-3) Y16(1,-3) Y17(1.5,-3) Y18(2,-3) Y19(2.5,-3) Y20(3,-3) Y21(3.5,-3) Y24(5,-3) Y25(5.5,-3) Y26(6,-3) Y27(6.5,-3)